# Altium footprint library WARG.PcbLib: 73 footprints (part 3 of 5)
Each footprint in its own frame and in the unit in brackets; x right, y up, seen from the top. Pads: shape width x height; smd on the part's side, far side on the other; paste and mask are expansions set on the pad; w line width, h text height; cw(c..) or ccw(c..) is an arc to the next point about the centre after c.
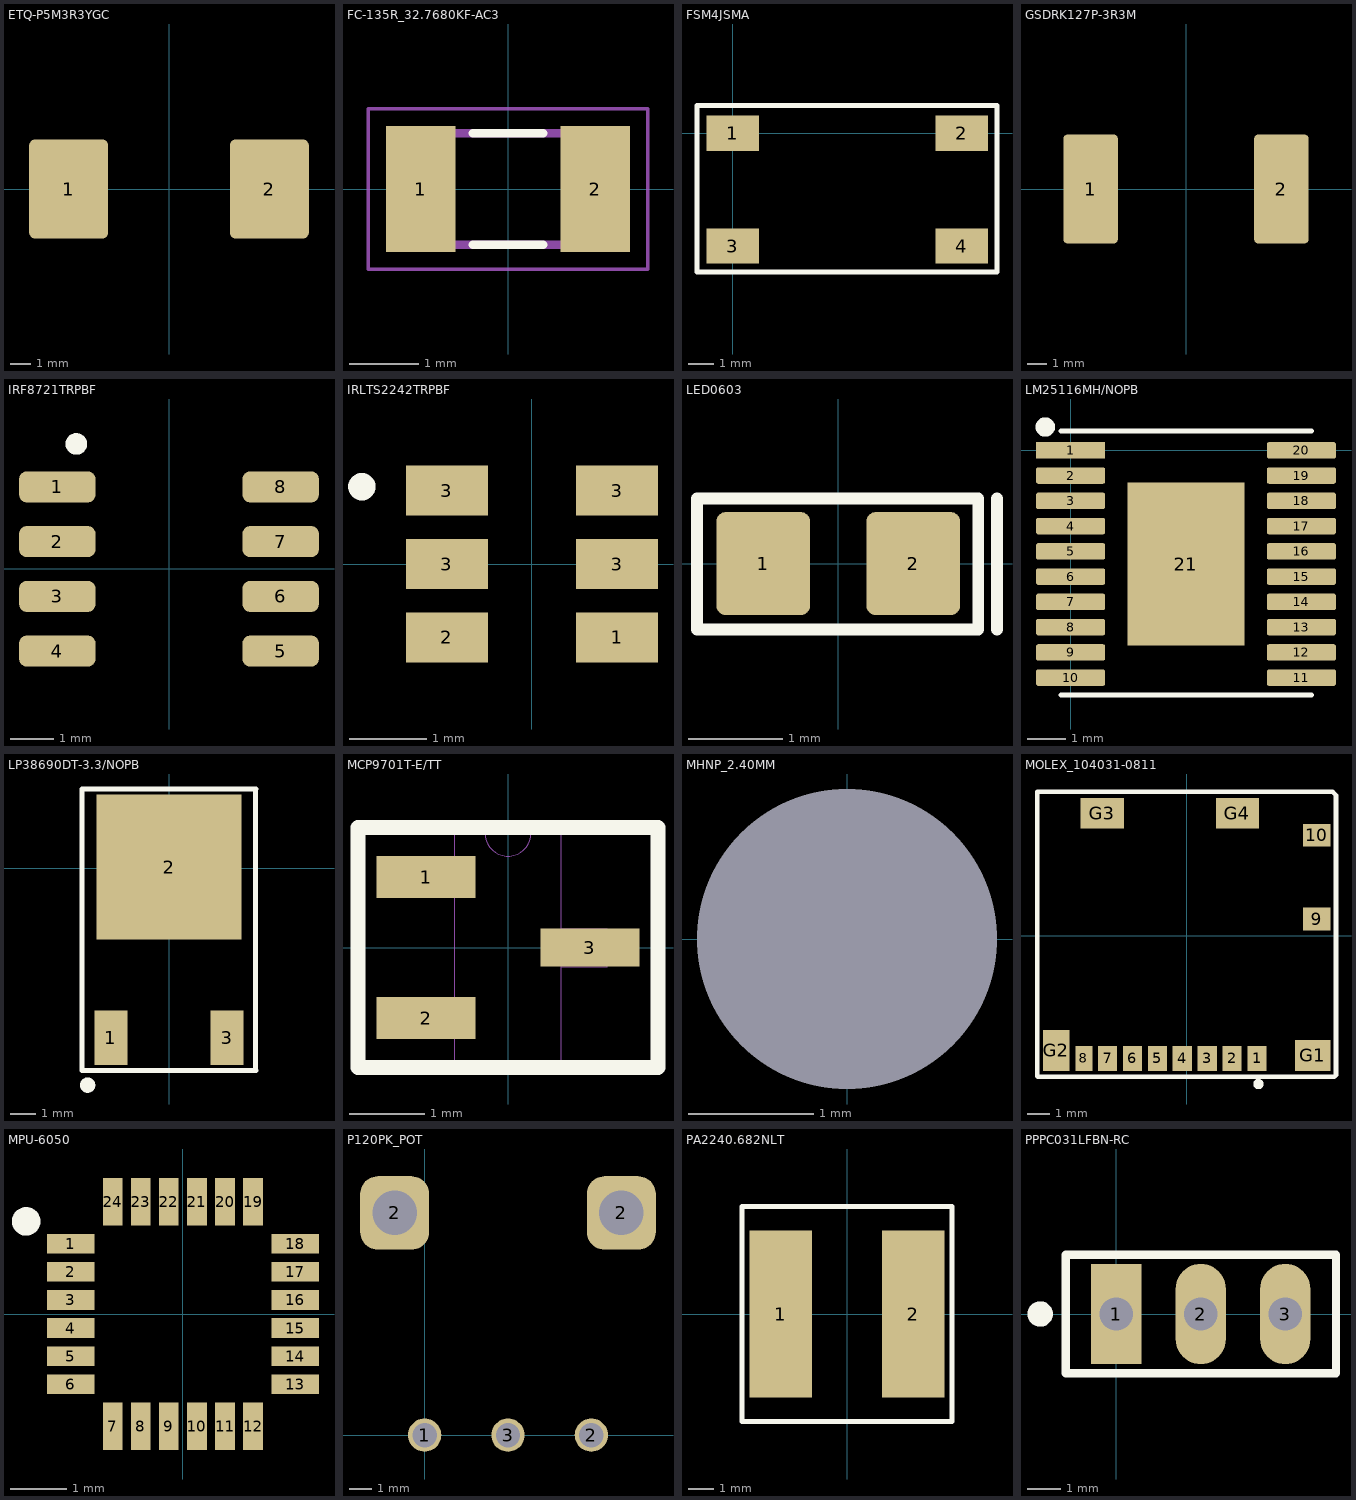
[diagram p2: the footprints below, top view; thin cyan lines are the x and y axes]

## ETQ-P5M3R3YGC [mm] "Ceramic Capacitor 1206"
height 0.55
pads (2):
  rrect15% 3.9x4.9 smd: 1(-4.95,0) 2(4.95,0)
3D body "ETQP5M3R3YGC.STEP": height 5.01, standoff 0.01, extent -5.4,-5 5.4,5

## FC-135R_32.7680KF-AC3 [mm]
pads (2):
  rect 1x1.8 smd: 1(-1.25,0) 2(1.25,0)
Top Overlay:
  lines w0.127: -0.5,-0.8 0.5,-0.8 ; -0.5,0.8 0.5,0.8
Mechanical 13:
  lines w0.127: -1.65,-0.8 1.65,-0.8 1.65,0.8 -1.65,0.8 -1.65,-0.8
Mechanical 15:
  lines w0.05: -2,-1.15 2,-1.15 2,1.15 -2,1.15 -2,-1.15
3D body "ABS07-32.768KHZ-9.STEP": height 0.91, standoff 0.01, extent -1.6,-0.75 1.6,0.75

## FSM4JSMA [mm]
pads (4):
  rect 2.1x1.4 smd: 1(0,0) 2(9.1,0) 3(0,-4.48) 4(9.1,-4.48)
Top Overlay:
  lines w0.2: -1.42,-5.505 -1.42,-4.8 -1.42,1.105 -1.121,1.105 -0.824,1.105 1.65,1.105 7.65,1.105 10.125,1.105 10.5,1.105 10.5,-0.22 10.5,-2.72 10.5,-5.505 9.865,-5.505 7.34,-5.505 1.69,-5.505 1.34,-5.505 -1.42,-5.505

## GSDRK127P-3R3M [mm] "IND 3.3UH 9.6A 10M OHM"
pads (2):
  rrect15% 2.8x5.6 smd: 1(-4.9,0) 2(4.9,0)
3D body: height 8, standoff 0, extent -6.25,-6.25 6.25,6.25

## IRF8721TRPBF [mm]
pads (8):
  rrect50% 1.78x0.72 smd: 1(-2.59,1.905) 2(-2.59,0.635) 3(-2.59,-0.635) 4(-2.59,-1.905) 5(2.59,-1.905) 6(2.59,-0.635) 7(2.59,0.635) 8(2.59,1.905)
Top Overlay:
  circle w0.25: c-2.15,2.9 r0.125
3D body "IRF8721TRPBF.stp": height 1.75, standoff 0, extent -3,-2.45 3,2.45

## IRLTS2242TRPBF [mm] "TSOP-6"
pads (6):
  rect 1.06x0.65 smd: 1(1.1,-0.95) 2(-1.1,-0.95) 3(-1.1,0) 3(-1.1,0.95) 3(1.1,0) 3(1.1,0.95)
Top Overlay:
  circle w0.254: c-2.2,1 r0.05
3D body "PG-TSOP-6-903_INF.step": height 1.45, standoff 0, extent -1.499,-1.499 1.499,1.499

## LED0603 [mm] "Generic LED in 0603 package"
height 0.55
pads (2):
  rrect20% 1x1.1 smd: 1(-0.8,0) 2(0.8,0)
Top Overlay:
  lines w0.127: 1.693,-0.705 1.693,0.695 ; -1.507,-0.705 1.493,-0.705 1.493,0.695 -1.507,0.695 -1.507,-0.705
Mechanical 13:
  lines w0.1: -0.875,-0.475 -0.875,0.475 ; 0.875,-0.475 0.875,0.475
3D body "ALSRobot-LED0603(G).step": height 0.6, standoff 0, extent -0.81,-0.4 0.81,0.4

## LM25116MH/NOPB [mm]
pads (21):
  rect 1.78x0.42 smd mask+0.08: 1(0,0)
  rrect25% 1.78x0.42 smd mask+0.08: 2(0,-0.65) 3(0,-1.3) 4(0,-1.95) 5(0,-2.6) 6(0,-3.25) 7(0,-3.9) 8(0,-4.55) 9(0,-5.2) 10(0,-5.85) 11(5.94,-5.85) 12(5.94,-5.2) 13(5.94,-4.55) 14(5.94,-3.9) 15(5.94,-3.25) 16(5.94,-2.6) 17(5.94,-1.95) 18(5.94,-1.3) 19(5.94,-0.65) 20(5.94,0)
  rect 3x4.2 smd mask+0.102: 21(2.97,-2.925)
Top Overlay:
  circle w0.3: c-0.65,0.6 r0.1
  lines w0.127: -0.25,-6.3 6.2,-6.3 ; -0.25,0.5 6.2,0.5
3D body "PWP0020A.stp": height 1, standoff 0, extent -0.24,-6.175 6.18,0.325
3D body: height 1.01, standoff 1, extent 1.27,-0.525 1.67,-0.125

## LP38690DT-3.3/NOPB [mm]
pads (3):
  rect 1.3x2.15 smd paste+0 mask+0: 1(-2.285,-6.665) 3(2.285,-6.665)
  rect 5.7x5.7 smd paste+0 mask+0: 2(0,0.051)
Top Overlay:
  circle w0.3: c-3.2,-8.525 r0.15
  lines w0.2: 3.404,-7.948 3.404,3.125 ; 3.429,-7.948 -3.429,-7.948 -3.429,3.125 3.429,3.125
3D body: height 0.25, standoff 0, extent 0,0 0.254,0.254
3D body "NDP0003B.stp": height 2.3, standoff -0.17, extent -3.29,-7.155 3.29,2.755

## MCP9701T-E/TT [mil]
pads (3):
  rect 52x22 smd: 1(-43,37) 2(-43,-37)
  rect 52x20 smd: 3(43,0)
Top Overlay:
  lines w7.87: -78.74,-62.99 -78.74,-47.24 -78.74,52.17 -78.74,62.99 -39.37,62.99 32.48,62.99 65.94,62.99 78.74,62.99 78.74,42.32 78.74,0.98 78.74,-52.17 78.74,-62.99 48.23,-62.99 -33.46,-62.99 -62.99,-62.99 -78.74,-62.99
Mechanical 13:
  lines w0: -28,-47 -52,-47 -52,-28 -28,-28 ; -28,-47 -28,-28 ; -28,-47 -28,-60 28,-60 28,-10 ; -28,-28 -28,28 ; -28,28 -52,28 -52,47 -28,47 ; -28,28 -28,47 ; -28,47 -28,60 -12,60 ; -12,60 ccw(c0,60) 12,60 ; -12,60 12,60 ; 12,60 28,60 28,10 ; 28,-10 52,-10 52,10 28,10 ; 28,-10 28,10
3D body "IRLML2060TRPBF.STEP": height 44.6, standoff 0.5, extent -49.41,-57.48 49.41,57.48

## MHNP_2.40MM [mm] "Mounting Hole Non-plated Diameter 2.40mm"
pads (1):
  round 0 hole 2.4: 1(0,0)

## MOLEX_104031-0811 [mm]
pads (14):
  rect 0.85x1.1 smd: 1(3.113,-5.412) 2(2.013,-5.412) 3(0.913,-5.412) 4(-0.188,-5.412) 5(-1.288,-5.412) 6(-2.387,-5.412) 7(-3.487,-5.412)
  rect 0.75x1.1 smd: 8(-4.537,-5.412)
  rect 1.2x1 smd: 9(5.748,0.738) 10(5.748,4.437)
  rect 1.55x1.35 smd: G1(5.573,-5.288)
  rect 1.17x1.8 smd: G2(-5.747,-5.062)
  rect 1.9x1.35 smd: G3(-3.722,5.413) G4(2.248,5.413)
Top Overlay:
  circle w0.25: c3.175,-6.55 r0.1
  lines w0.2: -6.6,-6.2 -6.6,-5.875 -6.6,5.95 -6.6,6.35 -5.65,6.35 2.325,6.35 5.525,6.35 6.45,6.35 6.6,6.2 6.6,5.612 6.6,-5.95 6.6,-6.15 6.525,-6.225 6.014,-6.225 -6.35,-6.225 -6.575,-6.225
3D body "104031-0811.stp": height 1.46, standoff 0.01, extent -5.967,-5.55 5.983,5.85

## MPU-6050 [mm]
pads (24):
  rect 0.85x0.35 smd: 1(-2,1.25) 2(-2,0.75) 3(-2,0.25) 4(-2,-0.25) 5(-2,-0.75) 6(-2,-1.25) 13(2,-1.25) 14(2,-0.75) 15(2,-0.25) 16(2,0.25) 17(2,0.75) 18(2,1.25)
  rect 0.35x0.85 smd: 7(-1.25,-2) 8(-0.75,-2) 9(-0.25,-2) 10(0.25,-2) 11(0.75,-2) 12(1.25,-2) 19(1.25,2) 20(0.75,2) 21(0.25,2) 22(-0.25,2) 23(-0.75,2) 24(-1.25,2)
Top Overlay:
  circle w0.254: c-2.794,1.651 r0.127
3D body "QFN24_4X4X0P9_IVS.step": height 0.94, standoff 0, extent -2.045,-2.045 2.045,2.045

## P120PK_POT [mm]
pads (5):
  round 1.5 hole 1.1: 1(0,0) 2(7.5,0) 3(3.75,0)
  rrect50% 3.1x3.3 hole 2 square: 2(-1.35,10) 2(8.85,10)
3D body "User Library-p120pk-f20.step": height 20.3, standoff -4, extent -2.642,-0.254 10.204,16.296

## PA2240.682NLT [mm]
pads (2):
  rect 2.5x6.7 smd: 1(-2.65,0) 2(2.65,0)
Top Overlay:
  lines w0.2: -4.2,-4.3 4.2,-4.3 4.2,4.3 -4.2,4.3 -4.2,-4.3
3D body "IND_PA2240PM2240_D6_7_PUL.step": height 7.01, standoff 0, extent -3.924,-4.026 3.924,4.026

## PPPC031LFBN-RC [mm] "3 Pin Female Header"
pads (3):
  rect 1.508x3.016 hole 1: 1(0,0)
  oval 1.508x3.016 hole 1: 2(2.54,0) 3(5.08,0)
Top Overlay:
  circle w0.508: c-2.286,0 r0.127
  lines w0.254: -1.524,-1.778 6.604,-1.778 6.604,1.778 -1.524,1.778 -1.524,-1.778
3D body "PPPC031LFBN-RC.stp": height 8.53, standoff -3.47, extent -1.52,-1.27 6.6,1.27